# Altium integrated library Cap-El-SMD_V2.IntLib: 121 symbols
Pins are listed as number, name and electrical type; pins without a type are passive.

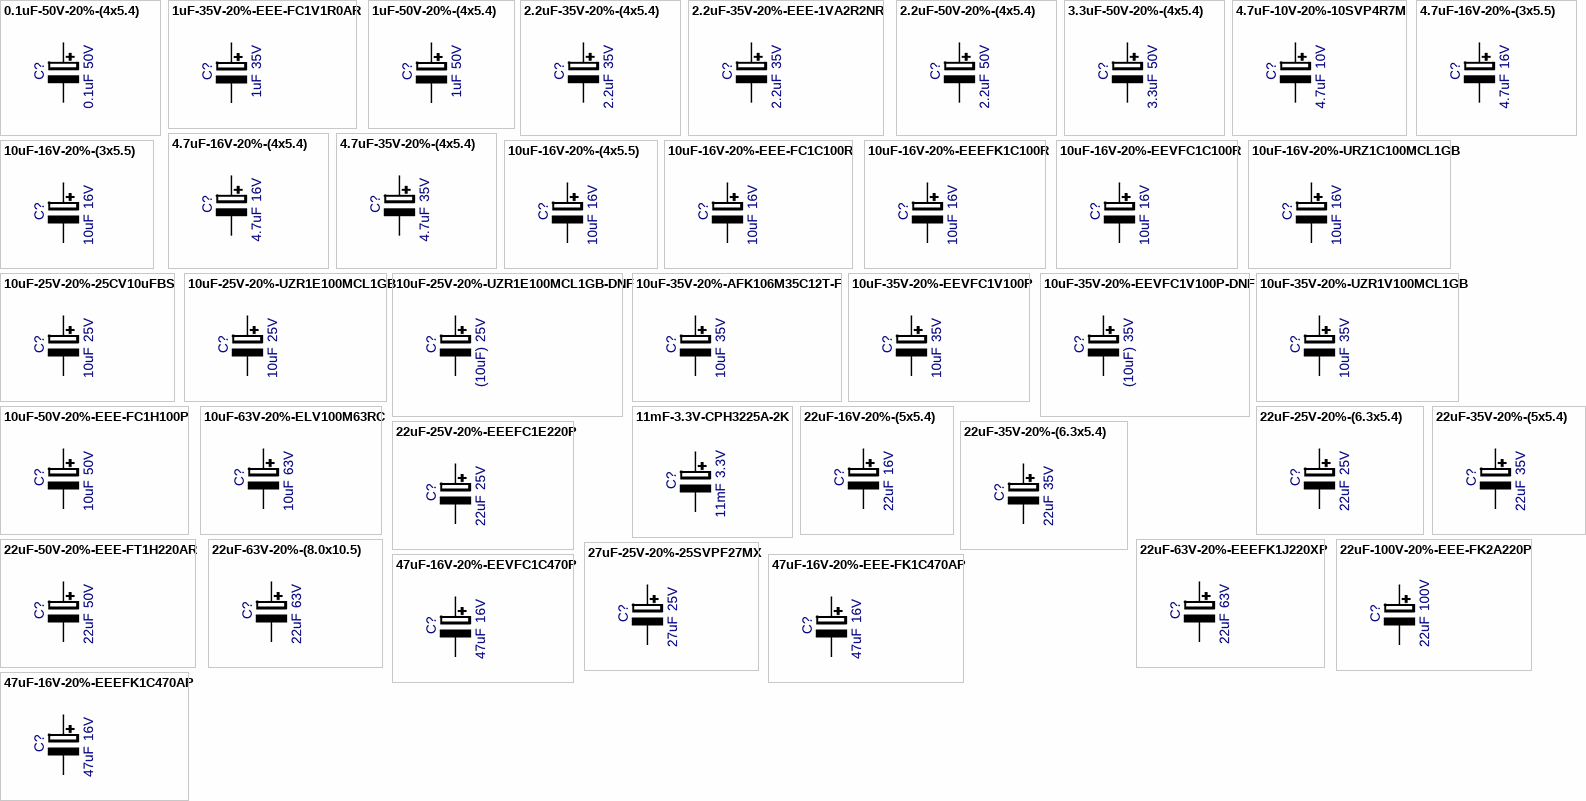
[diagram p0: symbols 0.1uF-50V-20%-(4x5.4) to 47uF-16V-20%-EEVFC1C470P]

## 0.1uF-50V-20%-(4x5.4)
designator C?, comment value 0.1uF  Voltage: 50V  (hidden comment: 0.1uF-50V-20%_4x5.4)
Cap Electrolytic SMD (4x5.4); Manufacturer: Various; Part Number: Cap El SMD 0.1uF-50V-20%_4x5.4; Tol: 20%; Package: CAP-EL-SMD-4x5.4; EDM-PN: *; Text2: *; Text1: *; DCE Part No: *
footprint CAP-EL-SMD-4X5.4 (CAP El SMD 4x5.4mm)
pins: 1, 2

## 1uF-35V-20%-EEE-FC1V1R0AR
designator C?, comment value 1uF  Voltage: 35V  (hidden comment: EEE-FC1V1R0AR)
Cap Electrolytic SMD (4x5.4) Low Imp; Manufacturer: Panasonic; Tol: 20%; Part Number: EEE-FC1V1R0AR; Package: CAP-EL-SMD-4x5.4; EDM-PN: *; Text2: *; Text1: *; DCE Part No: *
footprint CAP-EL-SMD-4X5.4 (CAP El SMD 4x5.4mm)
pins: 1, 2

## 1uF-50V-20%-(4x5.4)
designator C?, comment value 1uF  Voltage: 50V  (hidden comment: 1uF-50V-20%_4x5.4)
Cap Electrolytic SMD (4x5.4); Manufacturer: Various; Part Number: Cap El SMD 1uF-50V-20%_4x5.4; EDM-PN: CAP83; Tol: 20%; Package: CAP-EL-SMD-4x5.4; Text2: *; Text1: *; DCE Part No: *
footprint CAP-EL-SMD-4X5.4 (CAP El SMD 4x5.4mm)
pins: 1, 2

## 2.2uF-35V-20%-(4x5.4)
designator C?, comment value 2.2uF  Voltage: 35V  (hidden comment: 2.2uF-35V-20%_4x5.4)
Cap Electrolytic SMD (4x5.4); Manufacturer: Various; Part Number: Cap El SMD 2.2uF-35V-20%_4x5.4; Tol: 20%; Package: CAP-EL-SMD-4x5.4; EDM-PN: *; Text2: *; Text1: *; DCE Part No: *
footprint CAP-EL-SMD-4X5.4 (CAP El SMD 4x5.4mm)
pins: 1, 2

## 2.2uF-35V-20%-EEE-1VA2R2NR
designator C?, comment value 2.2uF  Voltage: 35V  (hidden comment: EEE-1VA2R2NR)
Cap Electrolytic SMD (4x5.4); Manufacturer: Panasonic; Tol: 20%; Part Number: EEE-1VA2R2NR; Package: CAP-EL-SMD-4x5.4; EDM-PN: *; Text2: *; Text1: *; DCE Part No: *
footprint CAP-EL-SMD-4X5.4 (CAP El SMD 4x5.4mm)
pins: 1, 2

## 2.2uF-50V-20%-(4x5.4)
designator C?, comment value 2.2uF  Voltage: 50V  (hidden comment: 2.2uF-50V-20%_4x5.4)
Cap Electrolytic SMD (4x5.4); Manufacturer: Various; Part Number: Cap El SMD 2.2uF-50V-20%_4x5.4; Tol: 20%; Package: CAP-EL-SMD-4x5.4; EDM-PN: *; Text2: *; Text1: *; DCE Part No: *
footprint CAP-EL-SMD-4X5.4 (CAP El SMD 4x5.4mm)
pins: 1, 2

## 3.3uF-50V-20%-(4x5.4)
designator C?, comment value 3.3uF  Voltage: 50V  (hidden comment: 3.3uF-50V-20%_4x5.4)
Cap Electrolytic SMD (4x5.4); Manufacturer: Various; Part Number: Cap El SMD 3.3uF-50V-20%_4x5.4; Tol: 20%; Package: CAP-EL-SMD-4x5.4; EDM-PN: *; Text2: *; Text1: *; DCE Part No: *
footprint CAP-EL-SMD-4X5.4 (CAP El SMD 4x5.4mm)
pins: 1, 2

## 4.7uF-10V-20%-10SVP4R7M
designator C?, comment value 4.7uF  Voltage: 10V  (hidden comment: 10SVP4R7M)
Cap Aluminum Polymer; Manufacturer: Panasonic; EDM-PN: CAP1380; Tol: 20%; Part Number: 10SVP4R7M; Package: CAP-EL-SMD-4x5.4; Text2: *; Text1: *; DCE Part No: *
footprint CAP-EL-SMD-4X5.4 (CAP El SMD 4x5.4mm)
pins: 1, 2

## 4.7uF-16V-20%-(3x5.5)
designator C?, comment value 4.7uF  Voltage: 16V  (hidden comment: 4.7uF-16V-20%_3x5.5)
Cap Electrolytic SMD (3x5.5); Manufacturer: Various; Part Number: Cap El SMD 4.7uF-16V-20%_3x5.5; EDM-PN: CAP1245; Tol: 20%; Package: CAP-EL-SMD-3x5.5; Text2: *; Text1: *; DCE Part No: *
footprint CAP-EL-SMD-3X5.4 (CAP El SMD 3x5.5mm)
pins: 1, 2

## 4.7uF-16V-20%-(4x5.4)
designator C?, comment value 4.7uF  Voltage: 16V  (hidden comment: 4.7uF-16V-20%_4x5.4)
Cap Electrolytic SMD (4x5.4); Manufacturer: Various; Part Number: Cap El SMD 4.7uF-16V-20%_4x5.4; Tol: 20%; Package: CAP-EL-SMD-4x5.4; EDM-PN: *; Text2: *; Text1: *; DCE Part No: *
footprint CAP-EL-SMD-4X5.4 (CAP El SMD 4x5.4mm)
pins: 1, 2

## 4.7uF-35V-20%-(4x5.4)
designator C?, comment value 4.7uF  Voltage: 35V  (hidden comment: 4.7uF-35V-20%_4x5.4)
Cap Electrolytic SMD (4x5.4); Manufacturer: Various; Part Number: Cap El SMD 4.7uF-50V-20%_4x5.4; Tol: 20%; Package: CAP-EL-SMD-4x5.4; EDM-PN: *; Text2: *; Text1: *; DCE Part No: *
footprint CAP-EL-SMD-4X5.4 (CAP El SMD 4x5.4mm)
pins: 1, 2

## 10uF-16V-20%-(3x5.5)
designator C?, comment value 10uF  Voltage: 16V  (hidden comment: 10uF-16V-20%_3x5.5)
Cap Electrolytic SMD (3x5.5); Manufacturer: Various; Part Number: Cap El SMD 10uF-16V-20%_3x5.5; EDM-PN: CAP1244; Tol: 20%; Package: CAP-EL-SMD-3x5.5; Text2: *; Text1: *; DCE Part No: *
footprint CAP-EL-SMD-3X5.4 (CAP El SMD 3x5.5mm)
pins: 1, 2

## 10uF-16V-20%-(4x5.5)
designator C?, comment value 10uF  Voltage: 16V  (hidden comment: 10uF-16V-20%_4x5.5)
Cap Electrolytic SMD (4x5.5); Manufacturer: Various; Part Number: Cap El SMD 10uF-16V-20%_4x5.5; EDM-PN: CAP143; Tol: 20%; Package: CAP-EL-SMD-4x5.5; Text2: *; Text1: *; DCE Part No: *
footprint CAP-EL-SMD-4X5.4 (CAP El SMD 4x5.4mm)
pins: 1, 2

## 10uF-16V-20%-EEE-FC1C100R
designator C?, comment value 10uF  Voltage: 16V  (hidden comment: EEE-FC1C100R)
Cap Electrolytic SMD (4x5.4) Low Imp; Manufacturer: Panasonic; EDM-PN: CAP855; Tol: 20%; Part Number: EEE-FC1C100R; Package: CAP-EL-SMD-4x5.4; Text2: *; Text1: *; DCE Part No: *
footprint CAP-EL-SMD-4X5.4 (CAP El SMD 4x5.4mm)
pins: 1, 2

## 10uF-16V-20%-EEEFK1C100R
designator C?, comment value 10uF  Voltage: 16V  (hidden comment: EEEFK1C100R)
Cap Electrolytic SMD (4x5.8) Low Imp; Manufacturer: Panasonic; EDM-PN: CAP1246; Tol: 20%; Reutech PN: 5910-EL-0185; Part Number: EEEFK1C100R; Package: CAP-EL-SMD-4x5.8; Text2: *; Text1: *; DCE Part No: *
footprint CAP-EL-SMD-4X5.8 (CAP El SMD 4x5.8mm)
pins: 1, 2

## 10uF-16V-20%-EEVFC1C100R
designator C?, comment value 10uF  Voltage: 16V  (hidden comment: EEVFC1C100R)
Cap Electrolytic SMD Low Imp; Manufacturer: Panasonic; Tol: 20%; Part Number: EEVFC1C100R; Package: CAP-EL-SMD-4x5.4; EDM-PN: *; Text2: *; Text1: *; DCE Part No: *
footprint CAP-EL-SMD-4X5.4 (CAP El SMD 4x5.4mm)
pins: 1, 2

## 10uF-16V-20%-URZ1C100MCL1GB
designator C?, comment value 10uF  Voltage: 16V  (hidden comment: URZ1C100MCL1GB)
Cap Electrolytic SMD (4x3.95); Manufacturer: Nichicon; Tol: 20%; Part Number: URZ1C100MCL1GB; Package: CAP-EL-SMD-4x3.95; EDM-PN: *; Text2: *; Text1: *; DCE Part No: *
footprint CAP-EL-SMD-4X3.95 (CAP El SMD 4x3.95mm)
pins: 1, 2

## 10uF-25V-20%-25CV10uFBS
designator C?, comment value 10uF  Voltage: 25V  (hidden comment: 25CV10uFBS)
Cap Electrolytic SMD; Manufacturer: Sanyo; EDM-PN: CAP82; Tol: 20%; Part Number: 25CV10uFBS; Package: CAP-EL-SMD-4x5.8; Text2: *; Text1: *; DCE Part No: *
footprint CAP-EL-SMD-4X5.8 (CAP El SMD 4x5.8mm)
pins: 1, 2

## 10uF-25V-20%-UZR1E100MCL1GB
designator C?, comment value 10uF  Voltage: 25V  (hidden comment: UZR1E100MCL1GB)
Cap Electrolytic SMD (5x3.95); Manufacturer: Nichicon; Tol: 20%; Part Number: UZR1E100MCL1GB; Package: CAP-EL-SMD-5x3.95; EDM-PN: *; Text2: *; Text1: *; DCE Part No: *
footprint CAP-EL-SMD-5.0x3.95 (CAP El SMD 5.0x3.95mm)
pins: 1, 2

## 10uF-25V-20%-UZR1E100MCL1GB-DNF
designator C?, comment value (10uF)  Voltage: 25V  (hidden comment: UZR1E100MCL1GB)
Cap Electrolytic SMD (5x3.95) - Do not Fit; Manufacturer: Nichicon; Part Number: DNF - UZR1E100MCL1GB; Tol: 20%; Package: CAP-EL-SMD-5x3.95; EDM-PN: *; Text2: *; Text1: *; DCE Part No: *
footprint CAP-EL-SMD-5.0x3.95 (CAP El SMD 5.0x3.95mm)
pins: 1, 2

## 10uF-35V-20%-AFK106M35C12T-F
designator C?, comment value 10uF  Voltage: 35V  (hidden comment: AFK106M35C12T-F)
Cap Electrolytic SMD Low Imp; Manufacturer: CDE; EDM-PN: CAP1381; Tol: 20%; Part Number: AFK106M35C12T-F; Package: CAP-EL-SMD-5.0x5.4; Text2: *; Text1: *; DCE Part No: *
footprint CAP-EL-SMD-5.0x5.8 (CAP El SMD 5.0x5.8mm)
pins: 1, 2

## 10uF-35V-20%-EEVFC1V100P
designator C?, comment value 10uF  Voltage: 35V  (hidden comment: EEVFC1V100P)
Cap Electrolytic SMD Low Imp; Manufacturer: Panasonic; EDM-PN: CAP835; Tol: 20%; Part Number: EEVFC1V100P; Package: CAP-EL-SMD-5.0x5.4; Text2: *; Text1: *; DCE Part No: *
footprint CAP-EL-SMD-5.0x5.4 (CAP El SMD 5.0x5.4mm)
pins: 1, 2

## 10uF-35V-20%-EEVFC1V100P-DNF
designator C?, comment value (10uF)  Voltage: 35V  (hidden comment: EEVFC1V100P)
Cap Electrolytic SMD Low Imp - Do not Fit; Manufacturer: Panasonic; Part Number: DNF - EEVFC1V100P; Tol: 20%; Package: CAP-EL-SMD-5.0x5.4; EDM-PN: *; Text2: *; Text1: *; DCE Part No: *
footprint CAP-EL-SMD-5.0x5.4 (CAP El SMD 5.0x5.4mm)
pins: 1, 2

## 10uF-35V-20%-UZR1V100MCL1GB
designator C?, comment value 10uF  Voltage: 35V  (hidden comment: UZR1V100MCL1GB)
Cap Electrolytic SMD (5x3.95); Manufacturer: Nichicon; Tol: 20%; Part Number: UZR1V100MCL1GB; Package: CAP-EL-SMD-5x3.95; EDM-PN: *; Text2: *; Text1: *; DCE Part No: *
footprint CAP-EL-SMD-5.0x3.95 (CAP El SMD 5.0x3.95mm)
pins: 1, 2

## 10uF-50V-20%-EEE-FC1H100P
designator C?, comment value 10uF  Voltage: 50V  (hidden comment: EEE-FC1H100P)
Cap Electrolytic SMD Low Imp; Manufacturer: Panasonic; Tol: 20%; Part Number: EEE-FC1H100P; Package: CAP-EL-SMD-6.3x5.4; EDM-PN: *; Text2: *; Text1: *; DCE Part No: *
footprint CAP-EL-SMD-6.3x5.4 (CAP El SMD 6.3x5.4mm)
pins: 1, 2

## 10uF-63V-20%-ELV100M63RC
designator C?, comment value 10uF  Voltage: 63V  (hidden comment: ELV100M63RC)
Cap Electrolytic SMD (6.3x5.5mm); Manufacturer: Hitano; Tol: 20%; Part Number: ELV100M63RC; Package: CAP-EL-SMD-6.3x5.4; EDM-PN: *; Text2: *; Text1: *; DCE Part No: *
footprint CAP-EL-SMD-6.3x5.4 (CAP El SMD 6.3x5.4mm)
pins: 1, 2

## 11mF-3.3V-CPH3225A-2K
designator C?, comment value 11mF  Voltage: 3.3V  (hidden comment: CPH3225A-2K)
Cap Supercapacitor 3.3V 1210; Manufacturer: Seiko Instruments; DCE Part No: 9704; Part Number: CPH3225A-2K; Package: CAP-CPH3225A; EDM-PN: *; Text2: *; Tol: *; Text1: *
footprint CAP-CPH3225A (CPH3225A 3.2x2.5mm)
pins: 1, 2

## 22uF-16V-20%-(5x5.4)
designator C?, comment value 22uF  Voltage: 16V  (hidden comment: 22uF-16V-20%-5x5.4)
Cap Electrolytic SMD (5x5.4); Manufacturer: Various; Part Number: Cap El SMD 22uF-16V-20%_5x5.4; Tol: 20%; Package: CAP-EL-SMD-5x5.4; EDM-PN: *; Text2: *; Text1: *; DCE Part No: *
footprint CAP-EL-SMD-5.0x5.4 (CAP El SMD 5.0x5.4mm)
pins: 1, 2

## 22uF-25V-20%-(6.3x5.4)
designator C?, comment value 22uF  Voltage: 25V  (hidden comment: 22uF-25V-20%-6.3x5.4)
Cap Electrolytic SMD (6.3x5.4); Manufacturer: Various; Part Number: Cap El SMD 22uF-25V-20%_6.3x5.4; Tol: 20%; Package: CAP-EL-SMD-6.3x5.4; EDM-PN: *; Text2: *; Text1: *; DCE Part No: *
footprint CAP-EL-SMD-6.3x5.4 (CAP El SMD 6.3x5.4mm)
pins: 1, 2

## 22uF-25V-20%-EEEFC1E220P
designator C?, comment value 22uF  Voltage: 25V  (hidden comment: EEEFC1E220P)
Cap Electrolytic SMD Low Imp; Manufacturer: Panasonic; Tol: 20%; Part Number: EEEFC1E220P; Package: CAP-EL-SMD-6.3x5.4; EDM-PN: *; Text2: *; Text1: *; DCE Part No: *
footprint CAP-EL-SMD-6.3x5.4 (CAP El SMD 6.3x5.4mm)
pins: 1, 2

## 22uF-35V-20%-(5x5.4)
designator C?, comment value 22uF  Voltage: 35V  (hidden comment: 22uF-35V-20%-5x5.4)
Cap Electrolytic SMD (5x5.4); Manufacturer: Various; Part Number: Cap El SMD 22uF-35V-20%_5x5.4; EDM-PN: CAP968; Tol: 20%; Package: CAP-EL-SMD-5x5.4; Text2: *; Text1: *; DCE Part No: *
footprint CAP-EL-SMD-5.0x5.4 (CAP El SMD 5.0x5.4mm)
pins: 1, 2

## 22uF-35V-20%-(6.3x5.4)
designator C?, comment value 22uF  Voltage: 35V  (hidden comment: 22uF-35V-20%-6.3x5.4)
Cap Electrolytic SMD (6.3x5.4); Manufacturer: Various; Part Number: Cap El SMD 22uF-35V-20%_6.3x5.4; Tol: 20%; Package: CAP-EL-SMD-6.3x5.4; EDM-PN: *; Text2: *; Text1: *; DCE Part No: *
footprint CAP-EL-SMD-6.3x5.4 (CAP El SMD 6.3x5.4mm)
pins: 1, 2

## 22uF-50V-20%-EEE-FT1H220AR
designator C?, comment value 22uF  Voltage: 50V  (hidden comment: EEE-FT1H220AR)
Cap Electrolytic SMD Low ESR (5.0x6.1); Manufacturer: Panasonic; Tol: 20%; Reutech PN: 5910-EL-0191; Part Number: EEE-FT1H220AR; Package: CAP-EL-SMD-5x5.8; EDM-PN: *; Text2: *; Text1: *; DCE Part No: *
footprint CAP-EL-SMD-5.0x5.8 (CAP El SMD 5.0x5.8mm)
pins: 1, 2

## 22uF-63V-20%-(8.0x10.5)
designator C?, comment value 22uF  Voltage: 63V  (hidden comment: 22uF-63V-20%-8.0x10.5)
Cap Electrolytic SMD (8.0x10.5); Manufacturer: Rubycon; Part Number: 63SGV22M8X10.5; Tol: 20%; Package: CAP-EL-SMD-8x10.5; EDM-PN: *; Text2: *; Text1: *; DCE Part No: *
footprint CAP-El-SMD-8x10.5 (CAP El SMD 8.0x10.5mm)
pins: 1, 2

## 22uF-63V-20%-EEEFK1J220XP
designator C?, comment value 22uF  Voltage: 63V  (hidden comment: EEEFK1J220XP)
Cap Electrolytic SMD Low Imp; Manufacturer: Panasonic; Tol: 20%; Part Number: EEEFK1J220XP; Package: CAP-EL-SMD-6.3x7.7; EDM-PN: *; Text2: *; Text1: *; DCE Part No: *
footprint CAP-EL-SMD-6.3X7.7 (CAP El SMD 6.3x7.7mm)
pins: 1, 2

## 22uF-100V-20%-EEE-FK2A220P
designator C?, comment value 22uF  Voltage: 100V  (hidden comment: EEE-FK2A220P)
Cap Electrolytic SMD (8.0x10.5); Manufacturer: Panasonic; Tol: 20%; Part Number: EEE-FK2A220P; Package: CAP-EL-SMD-8x10.5; EDM-PN: *; Text2: *; Text1: *; DCE Part No: *
footprint CAP-El-SMD-8x10.5 (CAP El SMD 8.0x10.5mm)
pins: 1, 2

## 27uF-25V-20%-25SVPF27MX
designator C?, comment value 27uF  Voltage: 25V  (hidden comment: 25SVPF27MX)
Cap Electrolytic SMD (5x5.9); Manufacturer: Panasonic; Tol: 20%; Part Number: 25SVPF27MX; Package: CAP-EL-SMD-5x5.8; EDM-PN: *; Text2: *; Text1: *; DCE Part No: *
footprint CAP-EL-SMD-5.0x5.8 (CAP El SMD 5.0x5.8mm)
pins: 1, 2

## 47uF-16V-20%-EEE-FK1C470AP
designator C?, comment value 47uF  Voltage: 16V  (hidden comment: EEE-FK1C470AP)
Cap Electrolytic SMD (6.3x5.8); Manufacturer: Panasonic; EDM-PN: CAP561; Tol: 20%; Part Number: EEE-FK1C470AP; Package: CAP-EL-SMD-6.3x5.8; Text2: *; Text1: *; DCE Part No: *
footprint CAP-EL-SMD-6.3x5.8 (CAP El SMD 6.3x5.4mm)
pins: 1, 2

## 47uF-16V-20%-EEEFK1C470AP
designator C?, comment value 47uF  Voltage: 16V  (hidden comment: EEEFK1C470AP)
Cap Electrolytic SMD (6.3x5.8) Low Imp; Manufacturer: Panasonic; Tol: 20%; Reutech PN: 5910-EL-0186; Part Number: EEEFK1C470AP; Package: CAP-EL-SMD-6.3x5.8; EDM-PN: *; Text2: *; Text1: *; DCE Part No: *
footprint CAP-EL-SMD-6.3x5.8 (CAP El SMD 6.3x5.4mm)
pins: 1, 2

## 47uF-16V-20%-EEVFC1C470P
designator C?, comment value 47uF  Voltage: 16V  (hidden comment: EEVFC1C470P)
Cap Electrolytic SMD Low Imp; Manufacturer: Panasonic; EDM-PN: CAP561; Tol: 20%; Part Number: EEVFC1C470P; Package: CAP-EL-SMD-6.3x5.4; Text2: *; Text1: *; DCE Part No: *
footprint CAP-EL-SMD-6.3x5.4 (CAP El SMD 6.3x5.4mm)
pins: 1, 2

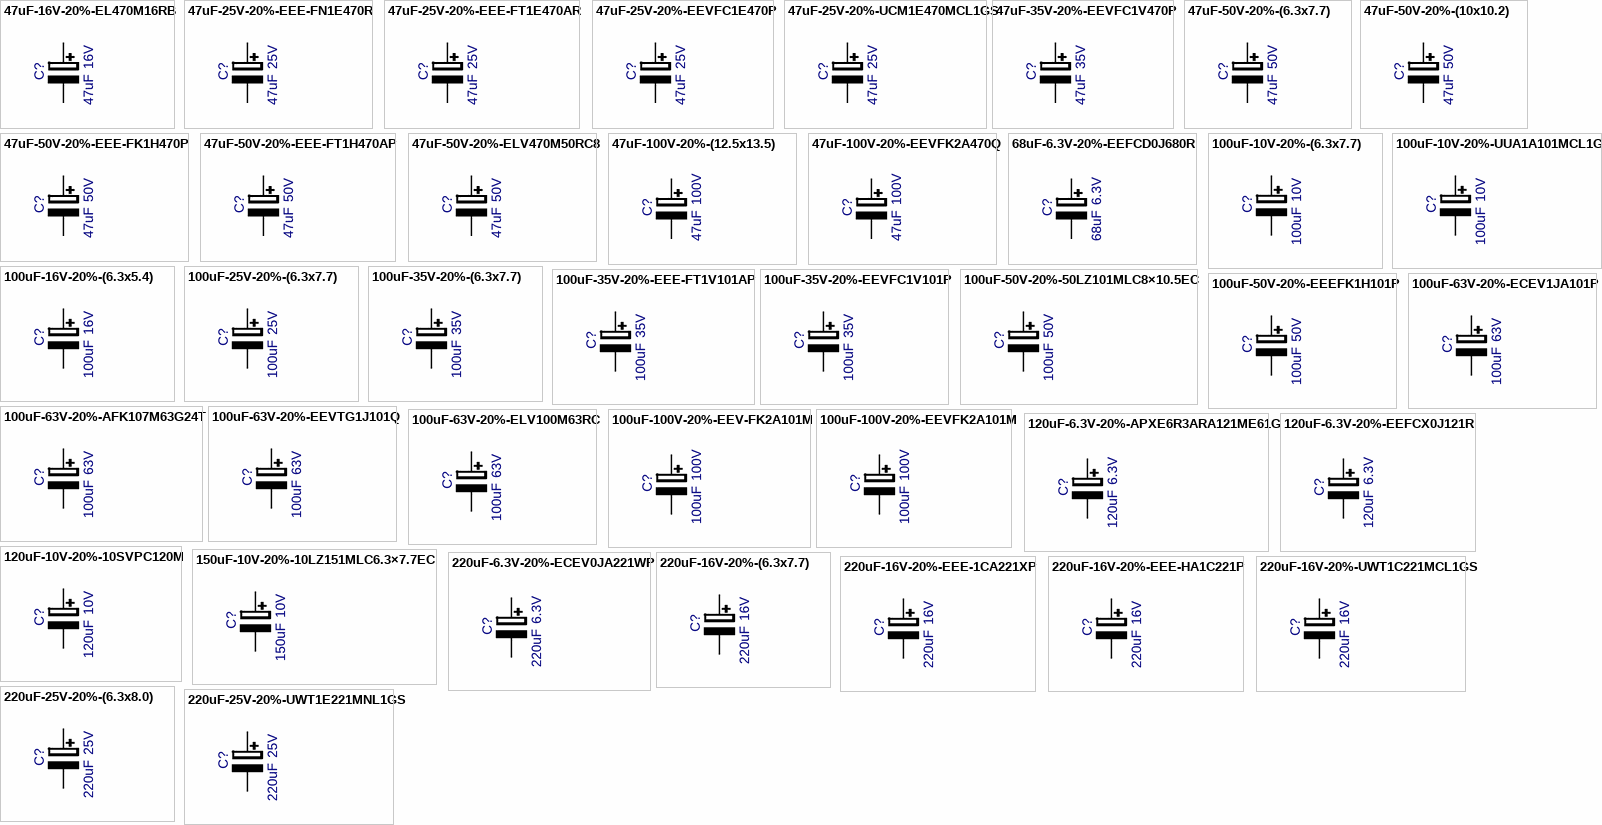
[diagram p1: symbols 47uF-16V-20%-EL470M16RB to 220uF-25V-20%-UWT1E221MNL1GS]

## 47uF-16V-20%-EL470M16RB
designator C?, comment value 47uF  Voltage: 16V  (hidden comment: EL470M16RB)
Cap Electrolytic SMD (5.0x5.5); Manufacturer: Hitano; DCE Part No: 10273; Tol: 20%; Part Number: EL470M16RB; Package: CAP-EL-SMD-5.0x5.4; EDM-PN: *; Text2: *; Text1: *
footprint CAP-EL-SMD-5.0x5.4 (CAP El SMD 5.0x5.4mm)
pins: 1, 2

## 47uF-25V-20%-EEE-FN1E470R
designator C?, comment value 47uF  Voltage: 25V  (hidden comment: EEE-FN1E470R)
Cap Electrolytic SMD; Manufacturer: Panasonic; Tol: 20%; Part Number: EEE-FN1E470R; Package: CAP-EL-SMD-5.0x5.4; EDM-PN: *; Text2: *; Text1: *; DCE Part No: *
footprint CAP-EL-SMD-5.0x5.4 (CAP El SMD 5.0x5.4mm)
pins: 1, 2

## 47uF-25V-20%-EEE-FT1E470AR
designator C?, comment value 47uF  Voltage: 25V  (hidden comment: EEE-FT1E470AR)
Cap Electrolytic SMD; Manufacturer: Panasonic; Tol: 20%; Part Number: EEE-FT1E470AR; Package: CAP-EL-SMD-5.0x5.4; EDM-PN: *; Text2: *; Text1: *; DCE Part No: *
footprint CAP-EL-SMD-5.0x5.4 (CAP El SMD 5.0x5.4mm)
pins: 1, 2

## 47uF-25V-20%-EEVFC1E470P
designator C?, comment value 47uF  Voltage: 25V  (hidden comment: EEVFC1E470P)
Cap Electrolytic SMD Low Imp; Manufacturer: Panasonic; Tol: 20%; Part Number: EEVFC1E470P; Package: CAP-EL-SMD-8x6.2; EDM-PN: *; Text2: *; Text1: *; DCE Part No: *
footprint CAP-El-SMD-8x6.5 (CAP El SMD 8.0x6.5mm)
pins: 1, 2

## 47uF-25V-20%-UCM1E470MCL1GS
designator C?, comment value 47uF  Voltage: 25V  (hidden comment: UCM1E470MCL1GS)
Cap Electrolytic SMD low Imp; Manufacturer: Nichicon; Tol: 20%; Part Number: UCM1E470MCL1GS; Package: CAP-EL-SMD-5.0x5.4; EDM-PN: *; Text2: *; Text1: *; DCE Part No: *
footprint CAP-EL-SMD-5.0x5.4 (CAP El SMD 5.0x5.4mm)
pins: 1, 2

## 47uF-35V-20%-EEVFC1V470P
designator C?, comment value 47uF  Voltage: 35V  (hidden comment: EEVFC1V470P)
Cap Electrolytic SMD Low Imp; Manufacturer: Panasonic; Tol: 20%; Part Number: EEVFC1V470P; Package: CAP-EL-SMD-8x6.2; EDM-PN: *; Text2: *; Text1: *; DCE Part No: *
footprint CAP-El-SMD-8x6.5 (CAP El SMD 8.0x6.5mm)
pins: 1, 2

## 47uF-50V-20%-(6.3x7.7)
designator C?, comment value 47uF  Voltage: 50V  (hidden comment: 47uF-50V-20%_6.3x7.7)
Cap Electrolytic SMD (6.3 x 7.7); Manufacturer: Various; Part Number: Cap El SMD 47uF-50V-20%-6.3x7.7; Tol: 20%; Package: CAP-EL-SMD-6.3x7.7; EDM-PN: *; Text2: *; Text1: *; DCE Part No: *
footprint CAP-EL-SMD-6.3X7.7 (CAP El SMD 6.3x7.7mm)
pins: 1, 2

## 47uF-50V-20%-(10x10.2)
designator C?, comment value 47uF  Voltage: 50V  (hidden comment: 47uF-50V-20%_10x10.2)
Cap Electrolytic SMD (10 x 10.2); Manufacturer: Various; Part Number: Cap El SMD 47uF-50V-20%-10x10.2; Tol: 20%; Package: CAP-EL-SMD-10x10.2; EDM-PN: *; Text2: *; Text1: *; DCE Part No: *
footprint CAP-EL-SMD-10x10.5 (CAP El SMD 10.0x10.0mm)
pins: 1, 2

## 47uF-50V-20%-EEE-FK1H470P
designator C?, comment value 47uF  Voltage: 50V  (hidden comment: EEE-FK1H470P)
Cap Electrolytic SMD Low Imp; Manufacturer: Panasonic; Tol: 20%; Part Number: EEE-FK1H470P; Package: CAP-EL-SMD-8x6.2; EDM-PN: *; Text2: *; Text1: *; DCE Part No: *
footprint CAP-El-SMD-8x6.5 (CAP El SMD 8.0x6.5mm)
pins: 1, 2

## 47uF-50V-20%-EEE-FT1H470AP
designator C?, comment value 47uF  Voltage: 50V  (hidden comment: EEE-FT1H470AP)
Cap Electrolytic SMD; Manufacturer: Panasonic; Tol: 20%; Part Number: EEE-FT1H470AP; Package: CAP-EL-SMD-6.3x5.8; EDM-PN: *; Text2: *; Text1: *; DCE Part No: *
footprint CAP-EL-SMD-6.3x5.8 (CAP El SMD 6.3x5.4mm)
pins: 1, 2

## 47uF-50V-20%-ELV470M50RC8
designator C?, comment value 47uF  Voltage: 50V  (hidden comment: ELV470M50RC8)
Cap Electrolytic SMD (6.3 x 7.7); Manufacturer: Hitano; DCE Part No: 8786; Tol: 20%; Part Number: ELV470M50RC8; Package: CAP-EL-SMD-6.3x7.7; EDM-PN: *; Text2: *; Text1: *
footprint CAP-EL-SMD-6.3X7.7 (CAP El SMD 6.3x7.7mm)
pins: 1, 2

## 47uF-100V-20%-(12.5x13.5)
designator C?, comment value 47uF  Voltage: 100V  (hidden comment: 47uF-100V-20%-12.5x13.5)
Cap Electrolytic SMD (12.5x13.5); Manufacturer: Various; Part Number: Cap El SMD 47uF 100V 20% 12.5x13.5; Tol: 20%; Package: CAP-EL-SMD-12.5x13.5; EDM-PN: *; Text2: *; Text1: *; DCE Part No: *
footprint CAP-EL-SMD-12.5x13.5 (CAP El SMD 12.5x13.5mm)
pins: 1, 2

## 47uF-100V-20%-EEVFK2A470Q
designator C?, comment value 47uF  Voltage: 100V  (hidden comment: EEVFK2A470Q)
Cap Electrolytic SMD (12.5x13.5); Manufacturer: Panasonic; Tol: 20%; Part Number: EEVFK2A470Q; Package: CAP-EL-SMD-12.5x13.5; EDM-PN: *; Text2: *; Text1: *; DCE Part No: *
footprint CAP-EL-SMD-12.5x13.5 (CAP El SMD 12.5x13.5mm)
pins: 1, 2

## 68uF-6.3V-20%-EEFCD0J680R
designator C?, comment value 68uF  Voltage: 6.3V  (hidden comment: EEFCD0J680R)
Cap Electrolytic SMD; Manufacturer: Panasonic; Tol: 20%; Part Number: EEFCD0J680R; Package: SP-CAP-CD; EDM-PN: *; Text2: *; Text1: *; DCE Part No: *
footprint SP-CAP-CD (Al Capacitor, 2-Leads, Body 7.3x4.3mm, IPC Medium Density)
pins: 1, 2

## 100uF-10V-20%-(6.3x7.7)
designator C?, comment value 100uF  Voltage: 10V  (hidden comment: 100uF-10V-20%_6.3x7.7)
Cap Electrolytic SMD (6.3 x 7.7); Manufacturer: Various; Part Number: Cap El SMD 100uF-10V-20%-6.3x7.7; EDM-PN: CAP800; Tol: 20%; Package: CAP-EL-SMD-6.3x7.7; Text2: *; Text1: *; DCE Part No: *
footprint CAP-EL-SMD-6.3X7.7 (CAP El SMD 6.3x7.7mm)
pins: 1, 2

## 100uF-10V-20%-UUA1A101MCL1GS
designator C?, comment value 100uF  Voltage: 10V  (hidden comment: UUA1A101MCL1GS)
Cap Electrolytic SMD (6.3 x 7.7); Manufacturer: Nichicon; EDM-PN: CAP800; Tol: 20%; Part Number: UUA1A101MCL1GS; Package: CAP-EL-SMD-6.3x7.7; Text2: *; Text1: *; DCE Part No: *
footprint CAP-EL-SMD-6.3X7.7 (CAP El SMD 6.3x7.7mm)
pins: 1, 2
